# Altium footprint library Vowstar_Basic_Device.PcbLib: 170 footprints (part 11 of 11)
Each footprint in its own frame and in the unit in brackets; x right, y up, seen from the top. Pads: shape width x height; smd on the part's side, far side on the other; paste and mask are expansions set on the pad; w line width, h text height; cw(c..) or ccw(c..) is an arc to the next point about the centre after c.
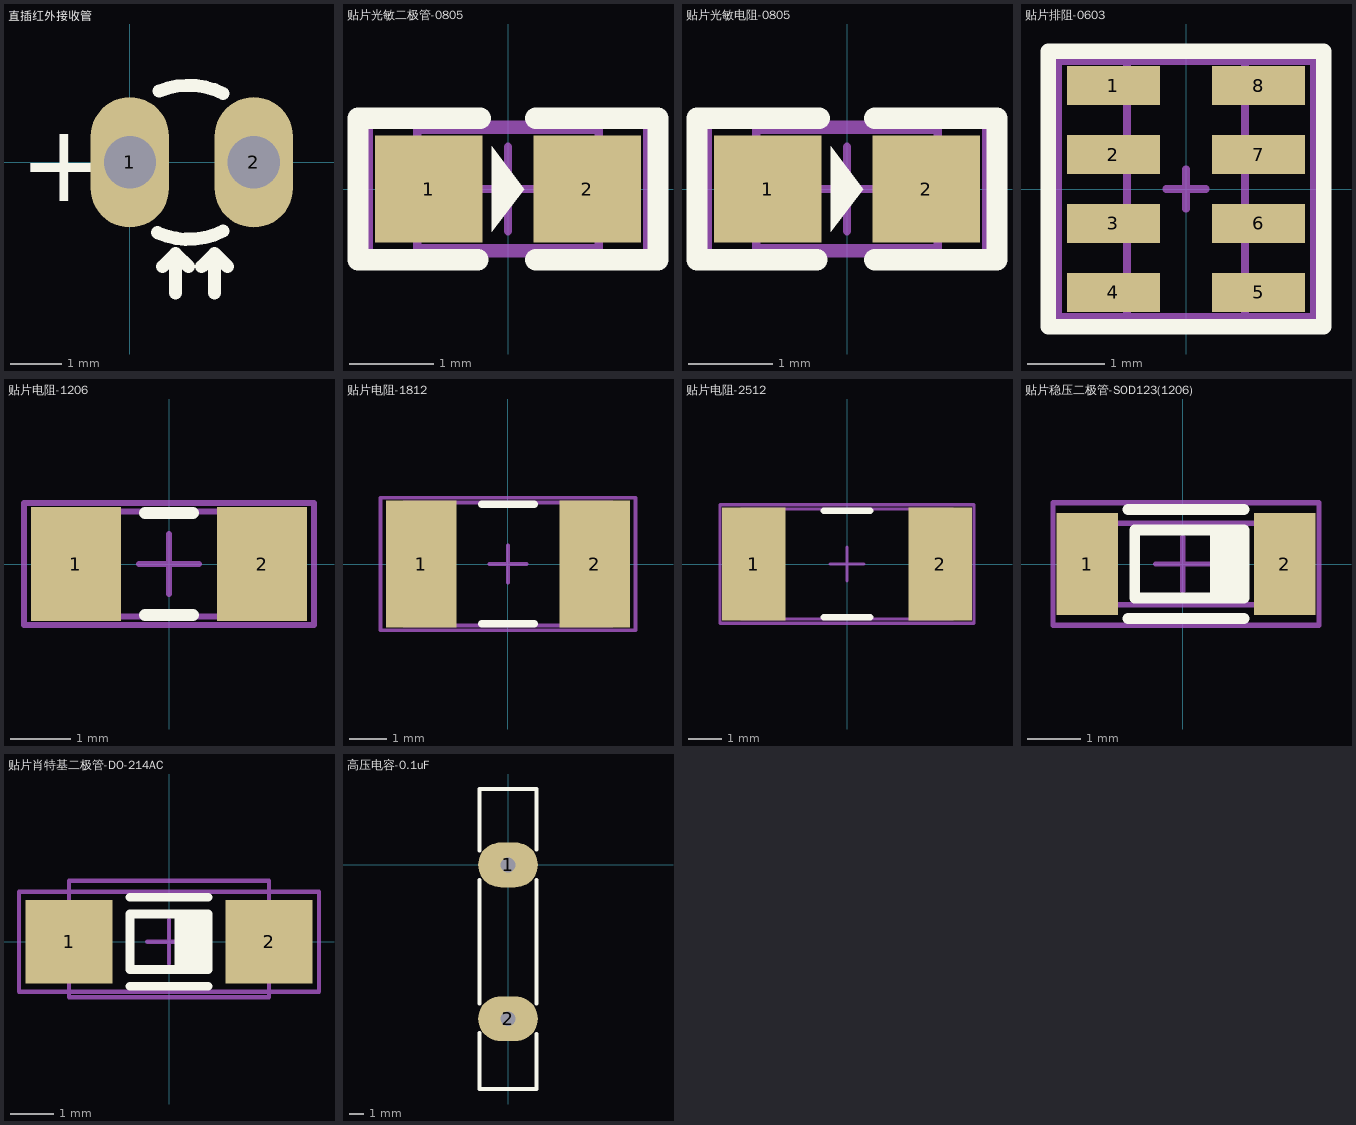
[diagram p10: the footprints below, top view; thin cyan lines are the x and y axes]

## 直插红外接收管 [mil] "直插红外接收管"
pads (2):
  oval 60x100 hole 40: 1(0,0) 2(95,0)
Top Overlay:
  lines w10: 21.02,-53.97 ccw(c45,0) 71.41,-52.82 ; 22.29,54.51 cw(c45,0) 71.41,52.82 ; 25,-80 35,-70 ; 35,-100 35,-70 ; 45,-80 35,-70 ; 55,-80 65,-70 ; 65,-100 65,-70 ; 75,-80 65,-70
  text "+" at -85,-30 h60

## 贴片光敏二极管-0805 [mil] "光敏二极管"
height 60
pads (2):
  rect 50x50 smd: 1(-37,0) 2(37,0)
Top Overlay:
  region: -7.5,20 7.5,0 -7.5,-20
  lines w10: -14,-33 -70,-33 -70,33 -13,33 ; 13,-33 70,-33 70,33 13,33
Mechanical 13:
  lines w3.94: -42.32,-27.56 42.32,-27.56 42.32,27.56 -42.32,27.56 -42.32,-27.56
Mechanical 15:
  lines w3.94: -19.69,0 19.68,0 ; 0,-19.68 0,19.69 ; -65,-30 65,-30 65,30 -65,30 -65,-30
3D body "User Library-LED SMD0805.step": height 33.45, standoff 0.23, extent -40.6,-18 40.6,17.68

## 贴片光敏电阻-0805 [mil] "光敏电阻"
height 60
pads (2):
  rect 50x50 smd: 1(-37,0) 2(37,0)
Top Overlay:
  region: -7.5,20 7.5,0 -7.5,-20
  lines w10: -14,-33 -70,-33 -70,33 -13,33 ; 13,-33 70,-33 70,33 13,33
Mechanical 13:
  lines w3.94: -42.32,-27.56 42.32,-27.56 42.32,27.56 -42.32,27.56 -42.32,-27.56
Mechanical 15:
  lines w3.94: -19.69,0 19.68,0 ; 0,-19.68 0,19.69 ; -65,-30 65,-30 65,30 -65,30 -65,-30
3D body "User Library-LED SMD0805.step": height 33.45, standoff 0.23, extent -40.6,-18 40.6,17.68

## 贴片排阻-0603 [mm] "贴片排阻-0603"
height 0.85
pads (8):
  rect 1.2x0.5 smd: 1(-0.937,1.333) 2(-0.937,0.445) 3(-0.937,-0.445) 4(-0.937,-1.333) 5(0.937,-1.333) 6(0.937,-0.445) 7(0.937,0.445) 8(0.937,1.333)
Top Overlay:
  lines w0.2: -1.778,-1.778 -1.778,1.778 1.778,1.778 1.778,-1.778 -1.778,-1.778
Mechanical 13:
  lines w0.1: -0.762,-1.651 0.762,-1.651 0.762,1.651 -0.762,1.651 -0.762,-1.651
Mechanical 15:
  lines w0.1: -0.254,0 0.254,0 ; 0,-0.254 0,0.254 ; -1.651,-1.651 -1.651,1.651 1.651,1.651 1.651,-1.651 -1.651,-1.651
3D body "User Library-Array-0603x4-Res.STEP": height 0.5, standoff 0, extent -0.813,-1.6 0.787,1.6

## 贴片电阻-1206 [mm] "Chip Resistor, Body 3.2x1.6mm, IPC Low Density"
height 0.71
pads (2):
  rect 1.5x1.9 smd: 1(-1.55,0) 2(1.55,0)
Top Overlay:
  lines w0.2: -0.4,-0.85 0.4,-0.85 ; -0.4,0.85 0.4,0.85
Mechanical 13:
  lines w0.1: -1.675,-0.875 1.675,-0.875 1.675,0.875 -1.675,0.875 -1.675,-0.875
Mechanical 15:
  lines w0.1: -0.5,0 0.5,0 ; 0,-0.5 0,0.5 ; -2.413,-1.016 2.413,-1.016 2.413,1.016 -2.413,1.016 -2.413,-1.016
3D body "User Library-1206(3216M) Res.step": height 1.53, standoff 0, extent -2,-0.8 2,0.8

## 贴片电阻-1812 [mm] "贴片电阻-1812"
height 1.7
pads (2):
  rect 1.9x3.4 smd: 1(-2.331,0) 2(2.331,0)
Top Overlay:
  lines w0.2: -0.7,-1.6 0.7,-1.6 ; -0.7,1.6 0.7,1.6
Mechanical 13:
  lines w0.1: -2.794,-1.651 2.794,-1.651 2.794,1.651 -2.794,1.651 -2.794,-1.651
Mechanical 15:
  lines w0.1: -0.5,0 0.5,0 ; 0,-0.5 0,0.5 ; -3.429,-1.778 3.429,-1.778 3.429,1.778 -3.429,1.778 -3.429,-1.778
3D body "User Library-1812(4532M) Res.step": height 2.54, standoff 0, extent -2.81,-1.6 2.81,1.6

## 贴片电阻-2512 [mm] "贴片电阻-2512"
height 1.7
pads (2):
  rect 1.9x3.4 smd: 1(-2.8,0) 2(2.8,0)
Top Overlay:
  lines w0.2: -0.7,-1.6 0.7,-1.6 ; -0.7,1.6 0.7,1.6
Mechanical 13:
  lines w0.1: -3.175,-1.651 -3.175,1.651 3.175,1.651 3.175,-1.651 -3.175,-1.651
Mechanical 15:
  lines w0.1: -0.5,0 0.5,0 ; 0,-0.5 0,0.5 ; -3.81,-1.778 -3.81,1.778 3.81,1.778 3.81,-1.778 -3.81,-1.778
3D body "User Library-2512(6432M) Res.step": height 0.6, standoff 0, extent -3.2,-1.6 3.2,1.6

## 贴片稳压二极管-SOD123(1206) [mil] "贴片稳压二极管"
height 60
pads (2):
  rect 45x75 smd: 1(-70,0) 2(75,0)
Top Overlay:
  region: 20,25 20,-25 45,-25 45,25
  lines w7.87: -40,-40 45,-40 ; -40,40 45,40 ; -35,-25 45,-25 45,25 5,25 -35,25 -35,-25
Mechanical 13:
  lines w3.94: -70,-30 75,-30 75,30 -70,30 -70,-30
Mechanical 15:
  lines w3.94: -19.69,0 19.68,0 ; 0,-19.68 0,19.69 ; -95,-45 -95,45 100,45 100,-45 -95,-45
3D body "User Library-Diode MELF(圆柱封装).step": height 59.06, standoff 0, extent -66.9,-29.53 70.9,29.53

## 贴片肖特基二极管-DO-214AC [mm] "贴片肖特基二极管-DO-214AC"
height 1.524
pads (2):
  rect 2x1.905 smd: 1(-2.286,0) 2(2.286,0)
Top Overlay:
  region: 0.127,0.635 0.127,-0.635 0.889,-0.635 0.889,0.635
  lines w0.2: -0.889,-1.016 0.889,-1.016 ; -0.889,1.016 0.889,1.016 ; -0.889,-0.635 -0.889,0.635 0.127,0.635 0.889,0.635 0.889,-0.635 -0.889,-0.635
Mechanical 13:
  lines w0.1: -2.286,-1.27 -2.286,1.397 2.286,1.397 2.286,-1.27 -2.286,-1.27
Mechanical 15:
  lines w0.1: -0.5,0 0.5,0 ; 0,-0.5 0,0.5 ; -3.429,-1.143 3.429,-1.143 3.429,1.143 -3.429,1.143 -3.429,-1.143
3D body "User Library-DO-214AC SMA.step": height 2.35, standoff -0.05, extent -2.575,-1.219 2.625,1.381

## 高压电容-0.1uF [mm] "高压电容0.1uF"
height 21
pads (2):
  oval 4x3 hole 1: 1(0,0) 2(0,-10.287)
Top Overlay:
  lines w0.254: -1.905,-9.271 -1.905,-1.016 ; 1.905,-11.303 1.905,-14.986 -1.905,-14.986 ; 1.905,-9.271 1.905,-1.016 ; 1.905,1.016 1.905,5.08 -1.905,5.08 ; -1.905,-14.986 -1.905,-11.239 -1.905,-14.986 ; -1.905,5.08 -1.905,0.953 -1.905,5.08
3D body: height 1, standoff -3, extent -0.381,-0.254 0.381,0.381
3D body: height 1, standoff -3, extent -0.381,-10.541 0.381,-9.906
3D body: height 18.98, standoff 1.02, extent -1.016,-14.172 0.984,3.758
3D body: height 3, standoff 0, extent -1.016,-11.049 1.016,1.143